# Altium footprint library Atlan.PcbLib: 283 footprints (part 12 of 18)
Each footprint in its own frame and in the unit in brackets; x right, y up, seen from the top. Pads: shape width x height; smd on the part's side, far side on the other; paste and mask are expansions set on the pad; w line width, h text height; cw(c..) or ccw(c..) is an arc to the next point about the centre after c.
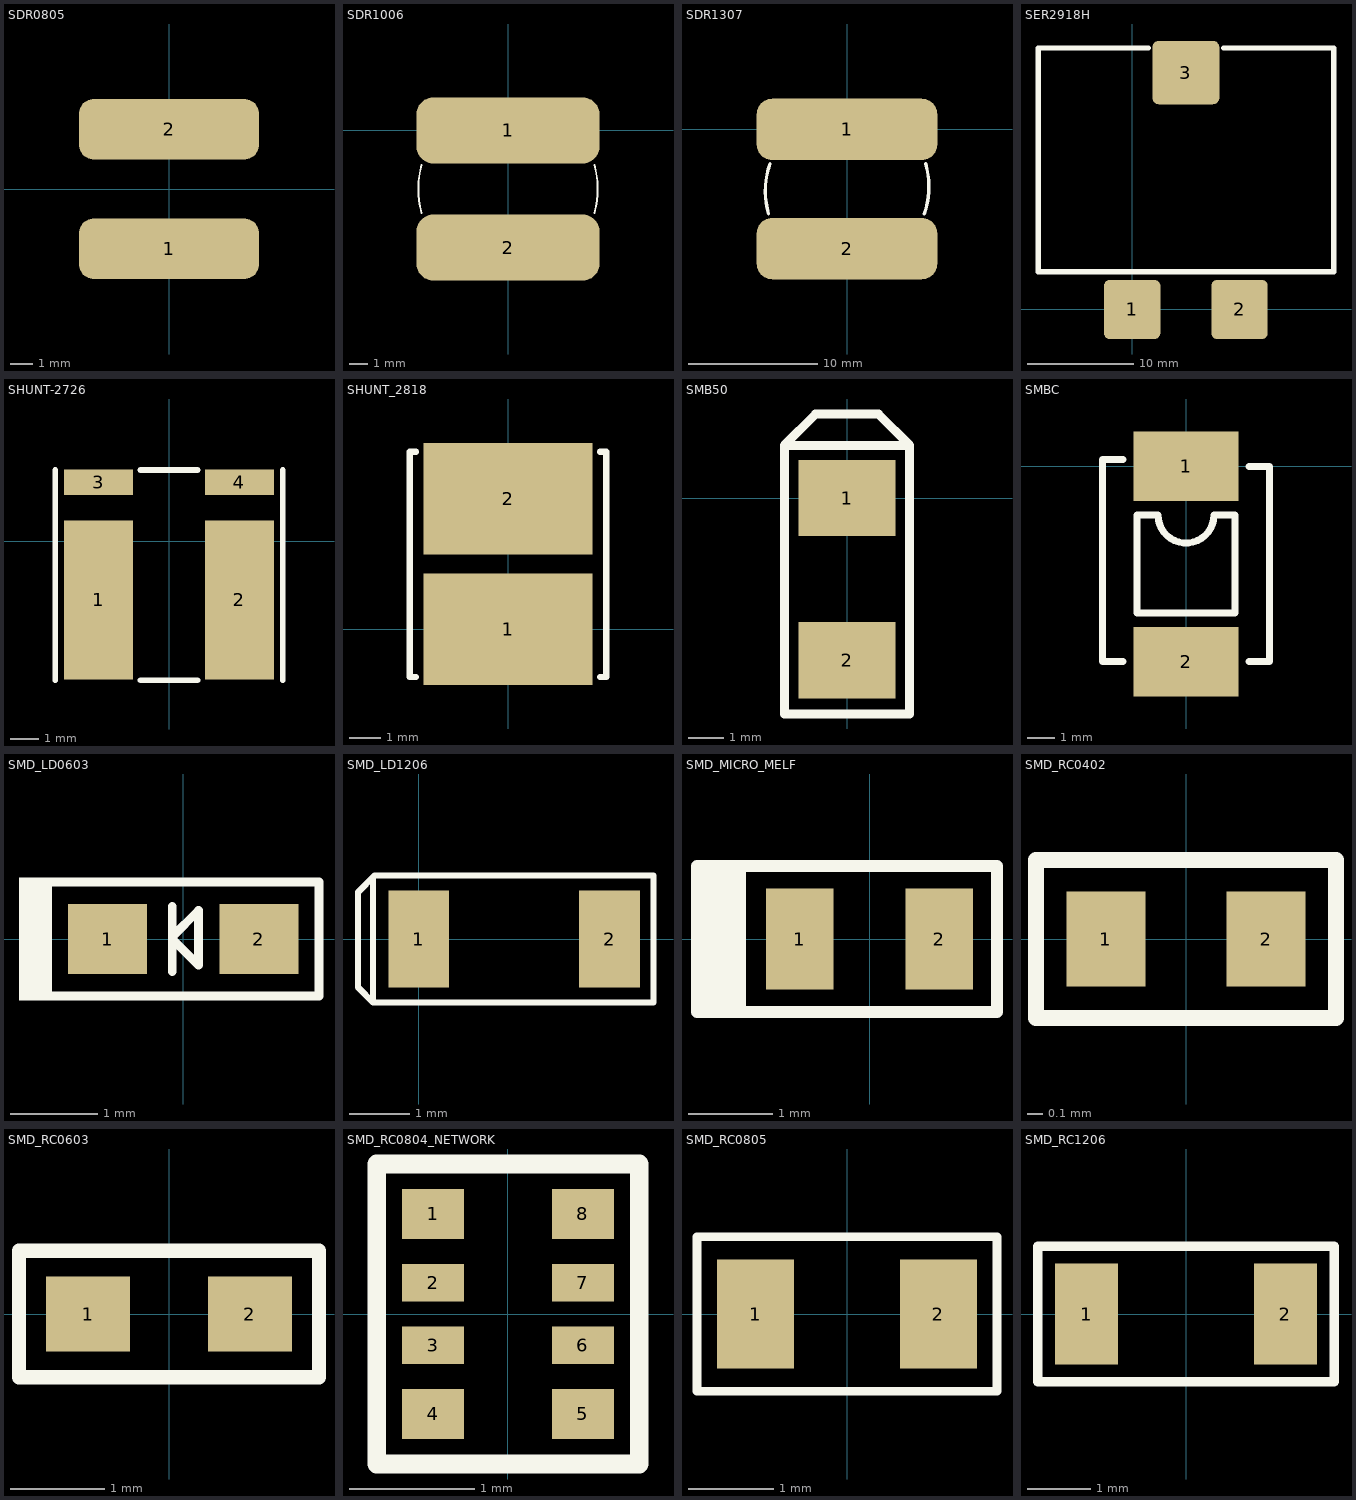
[diagram p11: the footprints below, top view; thin cyan lines are the x and y axes]

## SDR0805 [mm]
pads (2):
  rrect50% 8x2.7 smd: 1(0,-2.65) 2(0,2.65)
3D body "User Library-SDR0805.STEP": height 5.05, standoff 0, extent -3.7,-3.677 3.8,3.677

## SDR1006 [mm]
height 5.8
pads (2):
  rrect50% 10x3.6 smd: 1(0,0) 2(0,-6.4)
Top Overlay:
  lines w0.1: -4.723,-4.506 cw(c0,-3.2) -4.884,-2.805 cw(c0,-3.2) -4.723,-1.894 ; 4.723,-4.506 ccw(c0,-3.2) 4.884,-2.805 ccw(c0,-3.2) 4.723,-1.894
3D body: height 5.8, standoff 0, extent -4.861,-8.09 4.9,1.69

## SDR1307 [mm]
height 5.8
pads (2):
  rrect50% 14x4.75 smd: 1(0,0) 2(0,-9.25)
Top Overlay:
  lines w0.254: -6.078,-6.566 cw(c0.145,-4.788) -5.969,-2.667 ; 5.987,-6.566 ccw(c-0.127,-4.445) 6.096,-2.667
3D body: height 7, standoff 0, extent -6.449,-11.059 6.5,1.915

## SER2918H [mm]
height 17.8
pads (3):
  rrect20% 5.33x5.59 smd: 1(0,0) 2(10.15,0)
  rrect20% 6.35x6 smd: 3(5.075,22.4)
Top Overlay:
  lines w0.5: 1.524,24.715 -8.875,24.715 -8.875,3.556 19.05,3.556 19.05,24.715 8.651,24.715
3D body: height 17.8, standoff 0, extent -8.9,3.5 19,24.7

## SHUNT-2726 [mm]
pads (4):
  rect 2.44x5.6 smd: 1(-2.48,-2.067) 2(2.48,-2.067)
  rect 2.44x0.89 smd: 3(-2.48,2.068) 4(2.48,2.068)
Top Overlay:
  lines w0.2: -4,-4.9 -4,2.5 ; -1,-4.9 1,-4.9 ; -1,2.5 1,2.5 ; 4,-4.9 4,2.5
3D body "WSLP2726 (0.001).stp": height 2.7, standoff 0.02, extent -3.5,-4.2 3.4,2.4

## SHUNT_2818 [mm]
height 1.5
pads (2):
  rect 5.33x3.51 smd: 1(0,0) 2(0,4.12)
Top Overlay:
  lines w0.2: -2.9,-1.5 -3.1,-1.5 -3.1,5.6 -2.9,5.6 ; 2.9,-1.5 3.1,-1.5 3.1,5.6 2.9,5.6
3D body: height 1.5, standoff 0, extent -2.5,-1.5 2.5,5.5

## SMB50 [mil]
pads (2):
  rect 107.99x85 smd: 1(0,0) 2(0,-181.06)
Top Overlay:
  lines w10: -70,58.94 -35,93.94 35,93.94 70,58.94 ; -70,58.94 70,58.94 ; -70,58.94 -70,-241.06 70,-241.06 70,58.94

## SMBC [mil]
pads (2):
  rect 150x100 smd: 1(0,0) 2(0,-280)
Top Overlay:
  lines w10: -90,-280 -120,-280 -120,10 -90,10 ; 90,-280 120,-280 120,0 90,0 ; -70,-210 70,-210 70,-70 40,-70 cw(c0,-70) -40,-70 -70,-70 -70,-210

## SMD_LD0603 [mm]
pads (2):
  rect 0.9x0.8 smd: 1(-0.864,0) 2(0.864,0)
Top Overlay:
  rectangle: -1.875,-0.7 -1.55,0.7
  lines w0.1: -0.125,-0.375 -0.125,0 ; -0.125,0.375 -0.125,0 ; -0.125,0 -0.125,0.025 0.175,0.325 0.175,-0.3 -0.125,0 ; -1.55,-0.65 1.55,-0.65 1.55,0.65 -1.55,0.65 -1.55,-0.65
3D body "CC 0603.STEP": height 0.76, standoff 0, extent -0.762,-0.375 0.762,0.387

## SMD_LD1206 [mm]
pads (2):
  rect 1x1.6 smd: 1(0,0) 2(3.15,0)
Top Overlay:
  lines w0.1: -0.75,-1.05 3.875,-1.05 3.875,1.05 -0.725,1.05
  lines w0.102: -1,-0.8 -1,0.775 -0.725,1.05 -0.75,1.025 -0.75,-1.05 -1,-0.8
3D body "RC 1206.STEP": height 0.61, standoff -0.01, extent -0.035,-0.8 3.185,0.82

## SMD_MICRO_MELF [mm]
pads (2):
  rect 0.8x1.2 smd: 1(-0.826,0) 2(0.826,0)
Top Overlay:
  lines w0.14: -1.943,-0.864 -1.943,0.864 ; -1.841,-0.864 -1.841,0.864 ; -1.74,-0.864 -1.74,0.864 ; -1.638,-0.864 -1.638,0.864 ; -1.537,-0.864 -1.537,0.864 ; -2.045,-0.864 1.511,-0.864 1.511,0.864 -2.045,0.864 -2.045,-0.864

## SMD_RC0402 [mm]
pads (2):
  rect 0.5x0.6 smd: 1(-0.508,0) 2(0.508,0)
Top Overlay:
  lines w0.1: -0.95,-0.5 -0.95,0.5 0.95,0.5 0.95,-0.5 -0.95,-0.5
3D body "RC 0402.STEP": height 0.36, standoff -0.01, extent -0.51,-0.25 0.51,0.27

## SMD_RC0603 [mm]
pads (2):
  rect 0.9x0.8 smd: 1(-0.864,0) 2(0.864,0)
Top Overlay:
  lines w0.15: -1.6,-0.675 -1.6,0.675 1.6,0.675 1.6,-0.675 -1.6,-0.675
3D body "CC 0603.STEP": height 0.76, standoff 0, extent -0.762,-0.375 0.762,0.387

## SMD_RC0804_NETWORK [mm] "0804 [2010 Metric] Resistor Network"
height 0.45
pads (8):
  rect 0.5x0.4 smd mask+0.01: 1(-0.6,0.8) 4(-0.6,-0.8) 5(0.6,-0.8) 8(0.6,0.8)
  rect 0.5x0.3 smd mask+0.01: 2(-0.6,0.25) 3(-0.6,-0.25) 6(0.6,-0.25) 7(0.6,0.25)
Top Overlay:
  lines w0.15: -1.05,-1.2 -1.05,1.2 1.05,1.2 1.05,-1.2 -1.05,-1.2

## SMD_RC0805 [mm]
pads (2):
  rect 0.9x1.27 smd: 1(-1.067,0) 2(1.067,0)
Top Overlay:
  lines w0.1: -1.75,-0.9 -1.75,0.9 1.75,0.9 1.75,-0.9 -1.75,-0.9
3D body "CC 0805.STEP": height 1.27, standoff 0, extent -1.016,-0.625 1.016,0.645

## SMD_RC1206 [mm]
pads (2):
  rect 1x1.6 smd: 1(-1.575,0) 2(1.575,0)
Top Overlay:
  lines w0.15: -2.35,-1.075 -2.35,1.075 2.35,1.075 2.35,-1.075 -2.35,-1.075
3D body "RC 1206.STEP": height 0.61, standoff -0.01, extent -1.61,-0.8 1.61,0.82